# Altium footprint library 元件1.PcbLib: 420 footprints (part 19 of 27)
Each footprint in its own frame and in the unit in brackets; x right, y up, seen from the top. Pads: shape width x height; smd on the part's side, far side on the other; paste and mask are expansions set on the pad; w line width, h text height; cw(c..) or ccw(c..) is an arc to the next point about the centre after c.
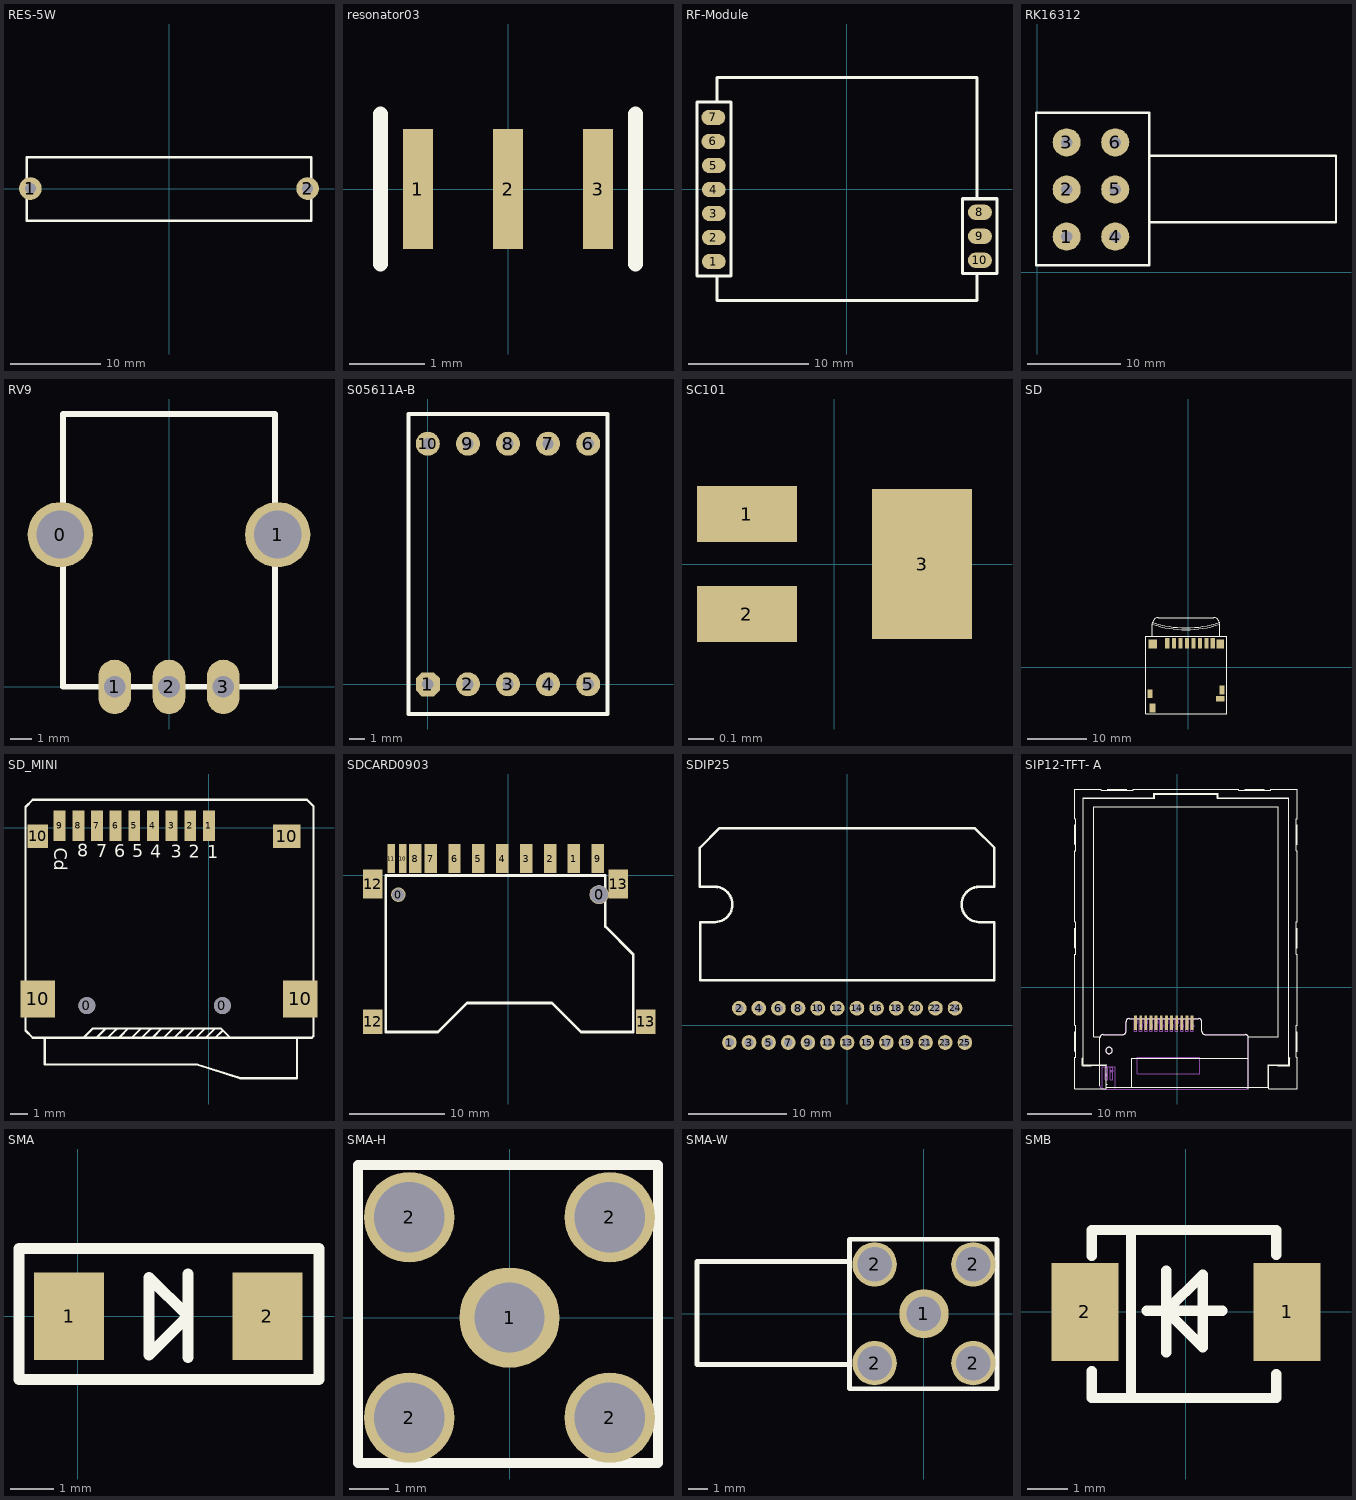
[diagram p18: the footprints below, top view; thin cyan lines are the x and y axes]

## RES-5W [mm]
pads (2):
  round 2.5 hole 1.2: 1(-15.291,0) 2(15.291,0)
Top Overlay:
  lines w0.254: -15.697,-3.556 -15.697,3.454 15.697,3.454 15.697,-3.556 -15.697,-3.556
3D body "水泥电阻 5w.s": height 4.35, standoff -6.85, extent -15.64,-3.52 15.64,3.48

## resonator03 [mm]
height 1.35
pads (3):
  rect 0.4x1.6 smd: 1(-1.2,0) 2(0,0) 3(1.2,0)
Top Overlay:
  lines w0.203: -1.7,-1 -1.7,1 ; 1.7,-1 1.7,1
3D body "SW3dPS-CSTCE_V-1.STEP": height 1.02, standoff -0.09, extent -1.6,-0.6 1.6,0.7

## RF-Module [mm]
pads (10):
  oval 2x1.27 smd: 1(-11.067,-6.005) 2(-11.067,-4.005) 3(-11.067,-2.005) 4(-11.067,-0.004) 5(-11.067,1.996) 6(-11.107,4.005) 7(-11.107,6.005) 8(11.107,-1.897) 9(11.107,-3.897) 10(11.107,-5.897)
Top Overlay:
  lines w0.254: -10.813,-7.326 -10.813,-9.231 10.853,-9.231 10.853,-7.097 ; -10.813,7.304 -10.813,9.311 10.853,9.311 10.853,-0.798 ; -12.464,-7.205 -12.464,7.295 -9.645,7.295 -9.645,-7.205 -12.464,-7.205 ; 9.659,-6.997 12.529,-6.997 12.53,-0.773 9.659,-0.773 9.659,-6.997
3D body "TEM610RF_V1.0.step": height 1.9, standoff -0.07, extent -10.846,-9.169 10.82,9.373

## RK16312 [mm]
pads (6):
  round 3 hole 1.2: 1(3.15,3.81) 2(3.15,8.839) 3(3.15,13.868) 4(8.331,3.81) 5(8.331,8.839) 6(8.331,13.868)
Top Overlay:
  lines w0.254: 11.963,12.421 31.902,12.421 31.902,5.334 11.989,5.334 ; -0.127,0.762 -0.127,17.018 11.963,17.018 11.963,0.762 -0.127,0.762
3D body "RK16312-L20.STEP": height 20.62, standoff -4, extent -0.124,-0.035 31.976,17.065

## RV9 [mm]
pads (5):
  round 3 hole 2.2: 0(-5,7) 1(5,7)
  oval 1.5x2.5 hole 1: 1(-2.5,0) 2(0,0) 3(2.5,0)
Top Overlay:
  lines w0.254: -4.876,0 -4.876,12.55 4.876,12.55 4.876,0 -4.876,0
3D body "User Library-RV09ACF-40_RK09K1130A5R.step": height 20, standoff -3.8, extent -4.876,0 4.876,12.55

## S05611A-B [mil]
pads (10):
  oct 60x60 hole 28: 1(0,0)
  round 60 hole 28: 2(100,0) 3(200,0) 4(300,0) 5(400,0) 6(400,600) 7(300,600) 8(200,600) 9(100,600) 10(0,600)
Top Overlay:
  lines w10: -48.03,-74.02 -48.03,674.02 448.03,674.02 448.03,-74.02 -48.03,-74.02
  text ".56'" at 100,280 h60
3D body "S5611A-B.STEP": height 316.25, standoff -156.19, extent -50,-75 450,675

## SC101 [mm]
height 0.5
pads (3):
  rect 0.4x0.225 smd: 1(-0.35,0.2) 2(-0.35,-0.2)
  rect 0.4x0.6 smd: 3(0.35,0)
3D body "SC101.STEP": height 0.5, standoff 0, extent -0.519,-0.32 0.521,0.32

## SD [mm]
pads (14):
  rect 0.7x1.75 smd: P$1(-3.509,4.048) P$2(-2.409,4.048) P$3(-1.309,4.048) P$4(-0.209,4.048) P$5(0.891,4.048) P$6(1.991,4.048) P$7(3.091,4.048) P$8(4.151,4.048)
  rect 1.5x1.5 smd: P$9(-5.959,3.948)
  rect 1.3x1.5 smd: P$10(5.391,3.948)
  rect 0.8x1.5 smd: P$11(5.691,-3.802)
  rect 1.45x1 smd: P$12(5.391,-5.302)
  rect 0.8x1.4 smd: P$13(-6.409,-4.452)
  rect 1x1.55 smd: P$14(-6.009,-6.852)
Top Overlay:
  lines w0.127: -6.009,5.207 -6.009,7.248 -6.009,7.348 cw(c-5.009,7.348) -5.009,8.348 4.291,8.348 cw(c4.291,7.348) 5.291,7.348 5.291,7.248 ; -6.009,7.248 ccw(c-0.359,24.348) 5.291,7.248 ; -6.009,7.548 ccw(c-0.359,24.648) 5.291,7.548 ; 5.291,5.207 5.291,7.248 ; -7.112,-7.874 6.477,-7.874 6.477,5.207 -7.112,5.207 -7.112,-7.874
3D body "MicroSD.STEP": height 1.85, standoff -0.05, extent -7.515,-7.86 6.735,7.34

## SD_MINI [mm]
pads (15):
  round 1 hole 1 unplated: 0(-7.2,-10.5) 0(0.8,-10.5)
  rect 0.7x1.8 smd: 1(0,0.127) 2(-1.1,0.127) 3(-2.2,0.127) 4(-3.3,0.127) 5(-4.4,0.127) 6(-5.5,0.127) 7(-6.6,0.127) 8(-7.7,0.127) 9(-8.8,0.127)
  rect 2.032x2.2 smd: 10(-10.1,-10.1) 10(5.4,-10.1)
  rect 1.2x1.4 smd: 10(-10.1,-0.5)
  rect 1.6x1.4 smd: 10(4.6,-0.5)
Top Overlay:
  lines w0.127: -9.677,-12.395 -9.677,-13.97 -0.686,-13.97 ; -6.629,-12.395 -6.096,-11.862 -6.096,-11.836 ; -5.969,-12.395 -5.461,-11.887 -5.461,-11.836 ; -5.232,-12.395 -5.232,-12.319 -4.75,-11.836 ; -4.547,-12.395 -3.988,-11.836 -3.962,-11.836 ; -3.962,-12.395 -3.429,-11.862 -3.429,-11.836 ; -3.327,-12.395 -2.769,-11.836 -2.667,-11.836 ; -2.667,-12.395 -2.108,-11.836 -2.083,-11.836 ; -2.032,-12.395 -1.499,-11.862 -1.499,-11.836 ; -1.397,-12.395 -0.838,-11.836 -0.711,-11.836 ; -0.762,-12.395 -0.203,-11.836 -0.178,-11.836 ; -0.711,-13.97 1.854,-14.783 5.207,-14.783 5.207,-12.421 ; -0.178,-12.395 0.381,-11.836 ; 0.381,-12.395 0.787,-11.989 0.864,-11.989 ; -10.389,-12.395 -10.82,-11.963 -10.82,1.219 -10.389,1.651 5.791,1.651 6.172,1.27 6.172,-12.294 6.071,-12.395 ; -10.389,-12.395 6.071,-12.395 ; -10.389,-12.395 -7.391,-12.395 -6.833,-11.836 0.711,-11.836 1.27,-12.395 6.071,-12.395
  text "Cd" at -9.119,-1.168 h0.76
  text "8" at -7.772,-1.727 h0.76
  text "7" at -6.655,-1.753 h0.76
  text "6" at -5.588,-1.753 h0.76
  text "5" at -4.521,-1.753 h0.76
  text "4" at -3.454,-1.778 h0.76
  text "3" at -2.261,-1.778 h0.76
  text "2" at -1.194,-1.778 h0.76
  text "1" at -0.102,-1.803 h0.76
3D body "sdcard.STEP": height 1.8, standoff -0.7, extent -10.372,-14.725 5.901,0.469

## SDCARD0903 [mm] "SD卡插座0903"
pads (17):
  round 1.524 hole 1.321: 0(-11.5,-2)
  round 2 hole 1.9: 0(9.5,-2)
  rect 1.3x3 smd: 1(6.875,1.778) 2(4.375,1.778) 3(1.875,1.778) 4(-0.625,1.778) 5(-3.125,1.778) 6(-5.625,1.778) 7(-8.125,1.778) 8(-9.75,1.778) 9(9.375,1.778)
  rect 0.762x3 smd: 10(-11.05,1.778) 11(-12.25,1.778)
  rect 2.032x2.54 smd: 12(-14.2,-15.3) 13(14.4,-15.3)
  rect 2.032x3.048 smd: 12(-14.2,-0.9) 13(11.5,-0.9)
Top Overlay:
  lines w0.279: -12.827,-16.383 -12.827,0 10.16,0 10.16,-5.334 13.081,-8.255 13.081,-16.383 7.62,-16.383 4.572,-13.335 0,-13.335 -4.318,-13.335 -7.366,-16.383 -12.827,-16.383
3D body "SD Kart.step": height 3, standoff -1, extent -14.224,-28.564 14.376,1.436

## SDIP25 [mm]
pads (25):
  round 1.5 hole 0.9: 1(-12,-1.75) 2(-11,1.75) 3(-10,-1.75) 4(-9,1.75) 5(-8,-1.75) 6(-7,1.75) 7(-6,-1.75) 8(-5,1.75) 9(-4,-1.75) 10(-3,1.75) 11(-2,-1.75) 12(-1,1.75) 13(0,-1.75) 14(1,1.75) 15(2,-1.75) 16(3,1.75) 17(4,-1.75) 18(5,1.75) 19(6,-1.75) 20(7,1.75) 21(8,-1.75) 22(9,1.75) 23(10,-1.75) 24(11,1.75) 25(12,-1.75)
Top Overlay:
  lines w0.254: -14.986,10.505 -14.986,4.6 15,4.6 15,10.53 ; -14.986,10.53 -13.437,10.53 ; -13.538,14.137 -15,14.137 -15,18.1 -13,20.1 13,20.1 15,18.1 15,14.137 ; 13.386,14.137 14.975,14.137 ; 13.437,10.53 14.975,10.53
  lines w0.257: -13.459,14.12 cw(c-13.5,12.321) -13.451,10.521 ; 13.426,14.12 ccw(c13.475,12.321) 13.433,10.521
3D body "HZIP25.step": height 19.2, standoff -2.5, extent -14.063,-1.882 15.138,6.528

## SIP12-TFT- A [mm]
pads (12):
  rect 0.43x2.3 smd: 1(2.305,-5.523) 2(1.505,-5.523) 3(0.705,-5.523) 4(-0.095,-5.523) 5(-0.895,-5.523) 6(-1.695,-5.523) 7(-2.495,-5.523) 8(-3.295,-5.523) 9(-4.095,-5.523) 10(-4.895,-5.523) 11(-5.695,-5.523) 12(-6.495,-5.523)
Top Overlay:
  circle w0.127: c-10.635,-9.83 r0.5
  lines w0.127: -15.793,-9.916 -15.993,-9.916 ; -15.793,-6.916 -15.993,-6.916 ; -15.793,6.184 -15.993,6.184 ; -15.793,9.184 -15.993,9.184 ; -15.793,22.284 -15.993,22.284 ; -15.793,25.284 -15.993,25.284 ; -14.243,-12.202 -14.243,-12.052 ; -12.036,-15.354 -12.036,-7.854 cw(c-11.536,-7.854) -11.536,-7.354 -8.476,-7.354 ccw(c-8.476,-6.854) -7.976,-6.854 -7.976,-5.354 cw(c-7.476,-5.354) -7.476,-4.854 3.324,-4.854 cw(c3.324,-5.354) 3.824,-5.354 3.824,-6.854 ccw(c4.324,-6.854) 4.324,-7.354 10.574,-7.354 cw(c10.574,-7.854) 11.074,-7.854 11.074,-15.516 ; -12.036,-7.696 -13.009,-7.696 -13.009,28.144 15.723,28.144 15.723,-7.696 11.074,-7.696 ; -11.043,-15.566 14.257,-15.566 ; -10.943,-15.516 14.157,-15.516 14.157,-12.052 17.323,-12.052 17.323,29.468 6.257,29.468 6.257,30.084 -3.543,30.084 -3.543,29.468 -14.609,29.468 -14.609,-12.052 -10.943,-12.052 ; -10.943,-15.066 -11.043,-15.066 -10.893,-15.066 ; -10.84,30.684 -10.84,30.884 ; -8.643,-15.566 -8.643,-15.516 ; -7.84,30.684 -7.84,30.884 ; -7.083,-15.494 -7.083,-11.002 11.057,-11.002 11.057,-15.824 ; 10.555,30.684 10.555,30.884 ; 11.857,-15.566 11.857,-15.516 ; 13.555,30.684 13.555,30.884 ; 14.107,-15.066 14.257,-15.066 14.157,-15.066 ; 17.157,-12.202 17.157,-12.052 ; 17.373,-4.466 17.373,22.214 ; 18.507,-9.916 18.707,-9.916 ; 18.507,-6.916 18.707,-6.916 ; 18.507,6.184 18.707,6.184 ; 18.507,9.184 18.707,9.184 ; 18.507,22.284 18.707,22.284 ; 18.507,25.284 18.707,25.284 ; -15.993,-9.916 -15.993,-6.916 ; -15.993,-9.916 -15.993,-6.916 ; -15.993,6.184 -15.993,9.184 ; -15.993,6.184 -15.993,9.184 ; -15.993,22.284 -15.993,25.284 ; -15.993,22.284 -15.993,25.284 ; -10.84,30.884 -7.84,30.884 ; -10.84,30.884 -7.84,30.884 ; 10.555,30.884 13.555,30.884 ; 10.555,30.884 13.555,30.884 ; 18.707,-9.916 18.707,-6.916 ; 18.707,-9.916 18.707,-6.916 ; 18.707,6.184 18.707,9.184 ; 18.707,6.184 18.707,9.184 ; 18.707,22.284 18.707,25.284 ; 18.707,22.284 18.707,25.284 ; -15.993,-15.816 -11.043,-15.816 -11.043,-12.102 -13.259,-12.102 -13.366,-12.202 -14.759,-12.202 -14.759,-11.062 -14.659,-10.898 -14.659,29.518 -3.643,29.518 -3.643,30.184 6.357,30.184 6.357,29.518 17.373,29.518 17.373,-10.898 17.473,-11.062 17.473,-12.202 15.657,-12.202 15.527,-12.102 14.257,-12.102 14.257,-15.816 18.707,-15.816 18.707,-10.916 18.507,-10.916 18.507,-5.916 18.707,-5.916 18.707,5.184 18.507,5.184 18.507,10.184 18.707,10.184 18.707,21.284 18.507,21.284 18.507,26.284 18.707,26.284 18.707,30.884 14.555,30.884 14.555,30.684 9.555,30.684 9.555,30.884 -6.84,30.884 -6.84,30.684 -11.84,30.684 -11.84,30.884 -15.993,30.884 -15.993,26.284 -15.793,26.284 -15.793,21.284 -15.993,21.284 -15.993,10.184 -15.793,10.184 -15.793,5.184 -15.993,5.184 -15.993,-5.916 -15.793,-5.916 -15.793,-10.916 -15.993,-10.916 -15.993,-15.816
Mechanical 3:
  drawing of 186 lines, arcs and shapes, not listed
  text "K" at -11.202,-14.855 h0.41
  text "A" at -10.395,-14.839 h0.41
3D body "LCD.STEP": height 2.2, standoff 0, extent -15.9,-15.68 18.6,30.92

## SMA [mil] "DO-214AC(2010)"
pads (2):
  rect 63x78.74 smd: 1(-8,0) 2(170.56,0)
Top Overlay:
  lines w10: 99,-37 99,38 ; -53,-57 -53,61 217,61 217,-57 -53,-57 ; 64,-35 64,35 99,0 64,-35
3D body "DO-214AC.STEP": height 94.49, standoff 0, extent -7.55,-52.15 173.55,54.15

## SMA-H [mil]
pads (5):
  round 100 hole 70: 1(0,0)
  round 90 hole 70: 2(-100,-100) 2(-100,100) 2(100,-100) 2(100,100)
Top Overlay:
  lines w10: -151,-145 148,-145 148,152 -151,152 -151,-145
3D body "SMA-H.stp": height 105.71, standoff -430.31, extent -124.21,-124.2 124.21,124.22

## SMA-W [mil]
pads (5):
  round 100 hole 70: 1(0,0)
  round 90 hole 70: 2(-100,-100) 2(-100,100) 2(100,-100) 2(100,100)
Top Overlay:
  lines w10: -152,-103 -460,-103 -460,106 -151,106 ; -151,-152 -151,151 148,151 148,-152 -151,-152
3D body "Samtec-SMA-J-P-H-RA-TH1.step": height 108.06, standoff -447.24, extent -459.69,-139.8 134.8,135.79

## SMB [mm] "DO-214AA"
pads (2):
  rect 1.65x2.4 smd: 1(2.475,0) 2(-2.475,0)
Top Overlay:
  lines w0.254: -2.311,-1.448 -2.311,-2.108 2.21,-2.108 2.21,-1.524 ; -2.311,1.372 -2.311,2.007 2.21,2.007 2.21,1.397 ; -1.346,-2.032 -1.346,2.007 ; -0.965,0.025 0.889,0.025 ; -0.483,-0.991 -0.483,1.016 ; -0.483,0.025 0.406,-0.864 0.406,0.914 -0.483,0.025
3D body "DI-214AA(SMB).step": height 2.45, standoff 0.03, extent -2.75,-1.975 2.75,1.925